# Altium footprint library 9-Pcblib_Con.PcbLib: 266 footprints (part 12 of 17)
Each footprint in its own frame and in the unit in brackets; x right, y up, seen from the top. Pads: shape width x height; smd on the part's side, far side on the other; paste and mask are expansions set on the pad; w line width, h text height; cw(c..) or ccw(c..) is an arc to the next point about the centre after c.
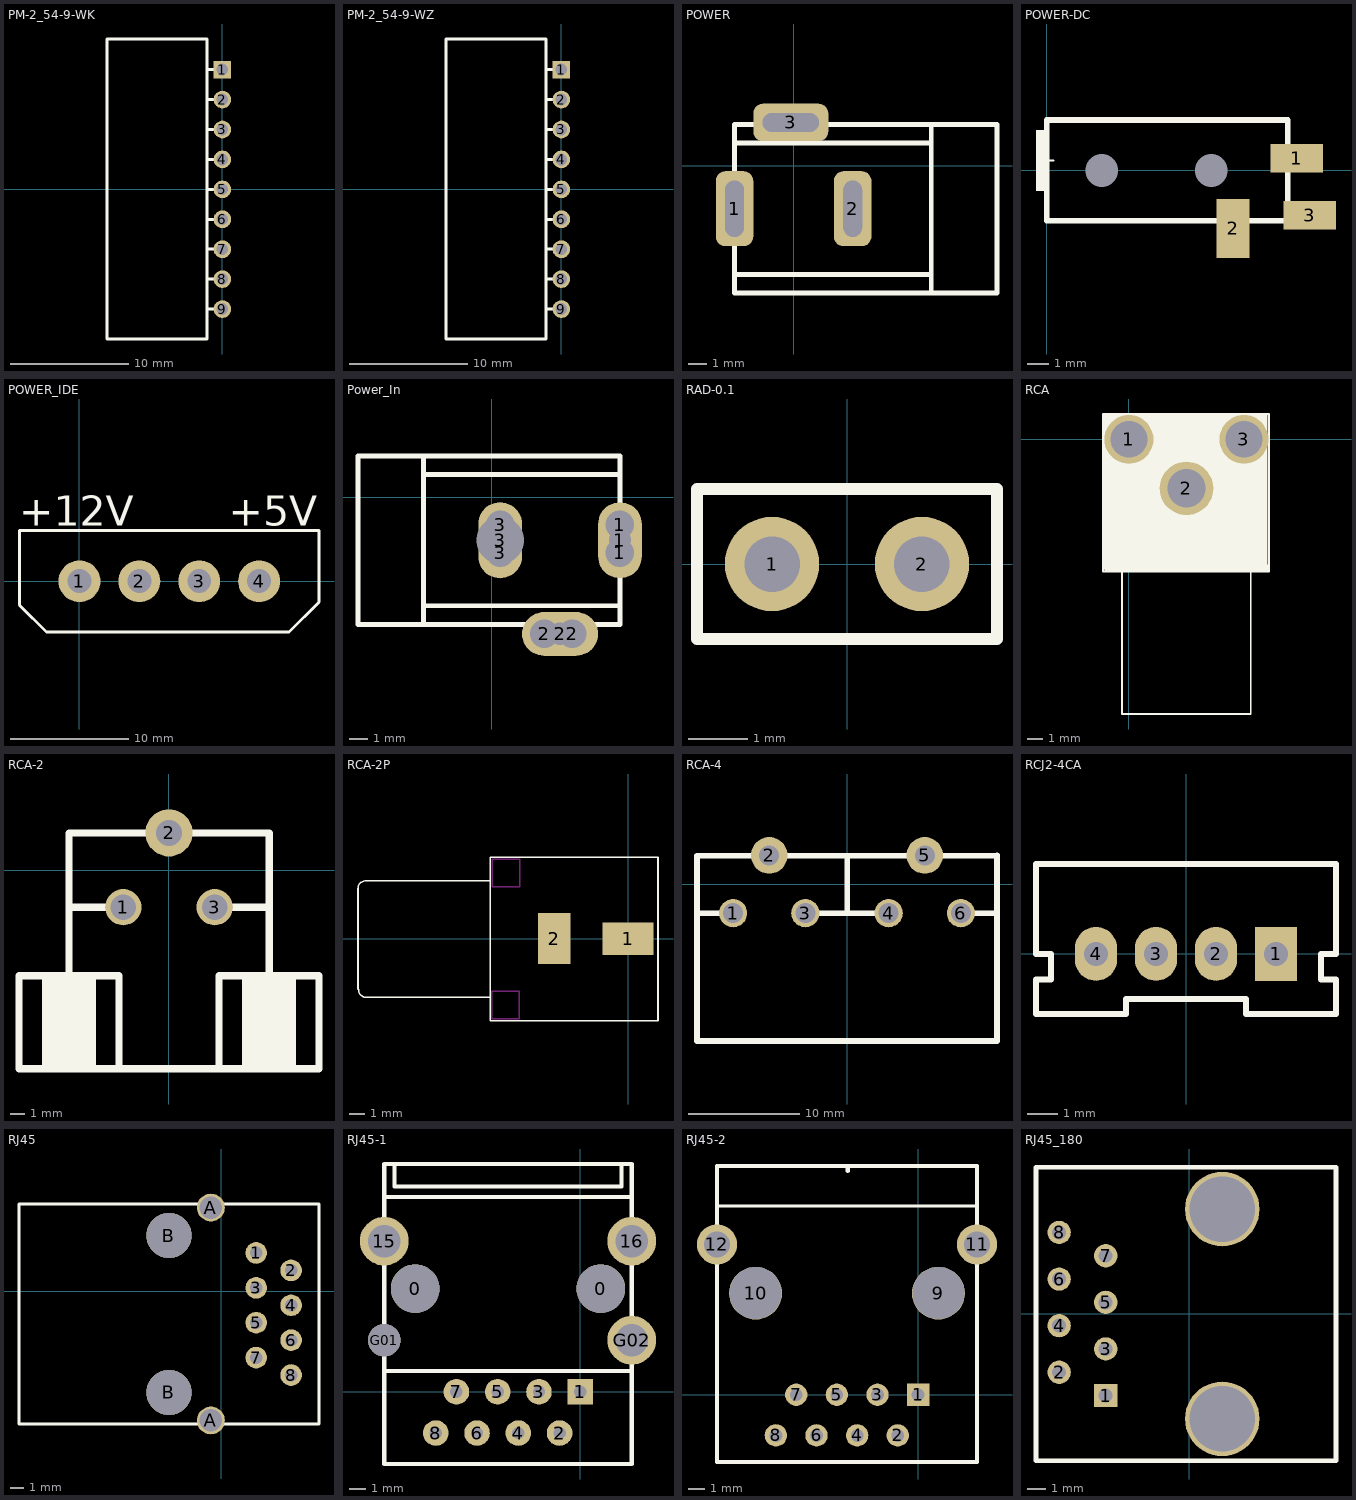
[diagram p11: the footprints below, top view; thin cyan lines are the x and y axes]

## PM-2_54-9-WK [mm]
pads (9):
  rect 1.5x1.5 hole 1: 1(0,10.16)
  round 1.5 hole 1: 2(0,7.62) 3(0,5.08) 4(0,2.54) 5(0,0) 6(0,-2.54) 7(0,-5.08) 8(0,-7.62) 9(0,-10.16)
Top Overlay:
  lines w0.254: -1.3,-7.62 0,-7.62 ; -1.3,2.54 0,2.54 ; -1.27,0 0,0 ; -1.27,5.08 0,5.08 ; -1.27,7.62 0,7.62 ; -1.245,-5.08 0,-5.08 ; -1.219,-2.54 0,-2.54 ; 0,-10.16 -1.3,-10.16 ; 0,10.16 -1.3,10.16 ; -1.3,-10.16 -1.3,10.16 ; -1.3,-10.16 -1.3,-12.7 -9.8,-12.7 -9.8,12.76 -1.3,12.76 -1.3,10.16
3D body: height 2.77, standoff -2.5, extent -9.795,-11.43 0.25,11.43

## PM-2_54-9-WZ [mm]
pads (9):
  rect 1.5x1.5 hole 1: 1(0,10.16)
  round 1.5 hole 1: 2(0,7.62) 3(0,5.08) 4(0,2.54) 5(0,0) 6(0,-2.54) 7(0,-5.08) 8(0,-7.62) 9(0,-10.16)
Top Overlay:
  lines w0.254: -1.3,-7.62 0,-7.62 ; -1.3,2.54 0,2.54 ; -1.27,0 0,0 ; -1.27,5.08 0,5.08 ; -1.27,7.62 0,7.62 ; -1.245,-5.08 0,-5.08 ; -1.219,-2.54 0,-2.54 ; 0,-10.16 -1.3,-10.16 ; 0,10.16 -1.3,10.16 ; -1.3,-10.16 -1.3,10.16 ; -1.3,-10.16 -1.3,-12.7 -9.8,-12.7 -9.8,12.76 -1.3,12.76 -1.3,10.16

## POWER [mm]
height 5.08
pads (3):
  rrect50% 2x4 hole 1 slot 3 at 90 deg: 1(-3.15,-2.3) 2(3.15,-2.3)
  rrect50% 4x2 hole 1 slot 3 at 0 deg: 3(-0.15,2.3)
Top Overlay:
  lines w0.254: -3.15,-5.805 7.34,-5.805 ; -3.15,1.205 7.34,1.205 ; 7.34,-6.796 7.34,2.196 ; -3.15,-6.796 -3.15,2.196 10.845,2.196 10.845,-6.796 -3.15,-6.796
3D body: height 11.02, standoff -3.48, extent -3.193,-6.803 10.633,2.703

## POWER-DC [mm]
pads (5):
  round 0 hole 1.5 mask+0: 0(2.5,0) 0(7.5,0)
  rect 2.4x1.3 smd: 1(11.4,0.55) 3(12,-2.05)
  rect 1.5x2.7 smd: 2(8.5,-2.65)
Top Overlay:
  rectangle: -0.5,-0.95 0.1,1.85
  lines w0.1: -0.2,0.45 0.3,0.45
  lines w0.254: 0,-2.3 11,-2.3 11,2.3 0,2.3 0,-2.3
3D body: height 4.4, standoff -0.8, extent 0.025,-3.875 12.625,2.425

## POWER_IDE [mil]
pads (4):
  round 140 hole 80: 1(0,0) 2(200,0) 3(400,0) 4(600,0)
Top Overlay:
  lines w10: 640,-170 700,-170 ; 800,-40 800,-70 ; 700,-170 -110,-170 -200,-80 -200,170 800,170 800,-70 ; 700,-170 800,-70
  text "+5V" at 498,185 h100
  text "+12V" at -202,185 h100
3D body: height 480, standoff 0, extent -158,-174 762,176

## Power_In [mil]
pads (9):
  rect 60x60 hole 60: 1(270,-116) 2(170,-287) 3(18,-57)
  oval 92x160 hole 47: 1(270,-90)
  rect 50x60 hole 60: 1(270,-57) 3(18,-116)
  rect 60x50 hole 60: 2(111,-287)
  oval 160x92 hole 47: 2(144,-287)
  oval 92x160 hole 100: 3(18,-90)
Top Overlay:
  lines w10: -143,-267 -143,87 ; -143,-228 270,-228 ; -143,48 270,48 ; -281,-267 -281,87 270,87 270,-267 -281,-267
3D body: height 433.86, standoff -137.01, extent -275.17,-285 269.17,89.23

## RAD-0.1 [mm]
pads (2):
  round 1.6 hole 0.94: 1(-1.27,0) 2(1.27,0)
Top Overlay:
  lines w0.2: -2.54,-1.27 2.54,-1.27 2.54,1.27 -2.54,1.27 -2.54,-1.27

## RCA [mm]
pads (3):
  round 3.2 hole 2.4: 1(0,0) 3(7.5,0)
  round 3.5 hole 2.5: 2(3.75,-3.2)
Top Overlay:
  rectangle: -1.676,-8.487 9.042,1.571
  rectangle: -1.6,-8.589 9.119,-8.157
  lines w0.127: -1.626,-8.611 9.119,-8.611 9.119,-8.433 ; -1.549,1.651 9.119,1.651 9.119,1.397 ; -1.473,-8.611 -1.676,-8.611 -1.676,-8.5 -1.676,1.651 -1.422,1.651 ; -0.457,-8.611 -0.457,-17.911 7.943,-17.911 7.943,-8.654 7.899,-8.611 ; 9.119,-8.5 9.119,1.448

## RCA-2 [mm]
pads (3):
  round 2.54 hole 1.8: 1(-3.2,-2.6) 3(3.2,-2.6)
  round 3.3 hole 1.8: 2(0,2.6)
Top Overlay:
  rectangle: -8.738,-13.9 -5.309,-7.4
  rectangle: 5.283,-13.9 8.738,-7.4
  lines w0.254: -8.75,-13.9 -8.75,-7.4 ; -5.25,-13.9 -5.25,-7.4 ; 5.25,-13.9 5.25,-7.4 ; 8.75,-13.9 8.75,-7.4
  lines w0.508: -7,-2.6 -3.25,-2.6 ; -3.5,-13.9 -3.5,-7.4 -7,-7.4 -10.5,-7.4 -10.5,-13.9 -7,-13.9 ; 3.19,-2.6 7,-2.6 ; 3.5,-13.9 3.5,-7.4 7,-7.4 10.5,-7.4 10.5,-13.9 7.017,-13.9 7.017,2.6 ; 7,-13.9 -7,-13.9 ; 7,2.6 -7,2.6 -7,-13.9
3D body: height 28.01, standoff -4.39, extent -8.371,-17.034 12.029,2.766

## RCA-2P [mm]
pads (2):
  rect 3.3x2.1 all layers, no hole: 1(0,0)
  rect 2.1x3.3 all layers, no hole: 2(-4.75,0)
Top Overlay:
  lines w0.1: -17.383,-3.242 -17.383,3.225 cw(c-16.883,3.225) -16.875,3.725 -8.875,3.725 ; -17.35,-3.275 ccw(c-16.85,-3.283) -16.85,-3.783 ; -16.875,-3.775 -8.875,-3.775 ; -8.875,-5.275 -8.875,5.225 1.925,5.225 1.925,-5.275 -8.875,-5.275
Keep-Out Layer:
  lines w0.1: -8.775,-5.125 -8.75,-5.15 -7,-5.15 -7,-3.375 -8.775,-3.375 -8.775,-5.125 ; -8.75,3.325 -8.75,5.1 -6.975,5.1 -6.975,3.325 -8.75,3.325
Mechanical 1:
  lines w0.1: -5.375,-1.225 -4.175,-1.225 -4.175,1.175 -5.375,1.175 -5.375,-1.225 ; -1.175,-0.625 -1.175,0.575 1.225,0.575 1.225,-0.625 -1.175,-0.625
3D body: height 11.86, standoff -3.64, extent -17.628,-5 1.872,5

## RCA-4 [mm]
pads (6):
  round 2.54 hole 1.8: 1(-10.25,-2.6) 3(-3.75,-2.6) 4(3.75,-2.6) 6(10.25,-2.6)
  round 3.3 hole 1.8: 2(-7,2.6) 5(7,2.6)
Top Overlay:
  lines w0.508: -13.483,-2.6 -10.25,-2.6 ; -3.81,-2.6 3.81,-2.6 ; 0.017,-2.505 0.017,2.575 ; 10.25,-2.6 13.467,-2.6 ; 12.971,2.575 13.479,2.575 ; 13.5,2.575 -13.5,2.575 -13.5,-14.1 13.5,-14.1 13.5,2.6
3D body: height 27.31, standoff -5.59, extent -17.324,-17.231 17.476,2.819

## RCJ2-4CA [mm]
height 5.08
pads (4):
  rect 1.4x1.8 hole 0.8: 1(3,0)
  oval 1.4x1.8 hole 0.8: 2(1,0) 3(-1,0) 4(-3,0)
Top Overlay:
  lines w0.2: -5.001,-2.007 -2,-2.007 -2,-1.499 2,-1.499 2,-2 5,-2 5,-0.85 4.5,-0.85 4.5,0 5,0 5,3 -5,3 -5,0 -4.5,0 -4.5,-0.85 -5,-0.85 -5,-2

## RJ45 [mil]
pads (12):
  round 62 hole 36: 1(100,110) 2(200,60) 3(100,10) 4(200,-40) 5(100,-90) 6(200,-140) 7(100,-190) 8(200,-240)
  round 80 hole 65: A(-30,-370) A(-30,240)
  round 130 hole 130: B(-150,-290) B(-150,160)
Top Overlay:
  lines w8: -580,-380 -580,250 280,250 280,-380 -580,-380

## RJ45-1 [mil]
pads (14):
  round 118.11 hole 118.11: 0(-400,250) 0(50,250)
  rect 62x62 hole 30: 1(0,0)
  round 62 hole 30: 2(-50,-100) 3(-100,0) 4(-150,-100) 5(-200,0) 6(-250,-100) 7(-300,0) 8(-350,-100)
  round 118.11 hole 78.74: 15(-475,365) 16(125,365) G02(125,125)
  round 78.74 hole 78.74: G01(-475,125)
Top Overlay:
  lines w10: -475,50 125,50 ; -475,472.24 125,472.24 ; -450,547.24 -450,497.24 100,497.24 100,547.24 ; -475,-175 125,-175 125,500 125,552.18 -475,552.18 -475,500 -475,-175
3D body: height 572.83, standoff -141.73, extent -523,-293.44 169.91,651.44

## RJ45-2 [mil]
pads (12):
  rect 55x55 hole 31.5: 1(0,0)
  round 55 hole 31.5: 2(-50,-100) 3(-100,0) 4(-150,-100) 5(-200,0) 6(-250,-100) 7(-300,0) 8(-350,-100)
  round 130 hole 127.95 unplated: 9(50,250) 10(-400,250)
  round 98.42 hole 62.99: 11(145,370) 12(-495,370)
Top Overlay:
  lines w8: -488.19,464.57 141.73,464.57
  lines w10: -495,-165.35 144.65,-165.35 145,-165 145,370 145,562.99 -495,562.99 -495,370 -495,-165 ; -173.23,551.18 -173.23,559.06
3D body: height 127.85, standoff -555.12, extent -490,-172.17 139.92,556.17

## RJ45_180 [mil]
height 53.15
pads (10):
  rect 50x50 hole 30: 1(-179.13,-175)
  round 50 hole 30: 2(-279.13,-125) 3(-179.13,-75) 4(-279.13,-25) 5(-179.13,25) 6(-279.13,75) 7(-179.13,125) 8(-279.13,175)
  round 160 hole 140: ""(70.87,-225) ""(70.87,225)
Top Overlay:
  lines w10: -328.74,-314.96 -328.74,314.96 314.96,314.96 314.96,-314.96 -328.74,-314.96
3D body: height 641.73, standoff -129.92, extent -313.88,-296.61 308.16,313.62